# Altium footprint library PCB_Lib_Devzone.PcbLib: 491 footprints (part 27 of 31)
Each footprint in its own frame and in the unit in brackets; x right, y up, seen from the top. Pads: shape width x height; smd on the part's side, far side on the other; paste and mask are expansions set on the pad; w line width, h text height; cw(c..) or ccw(c..) is an arc to the next point about the centre after c.
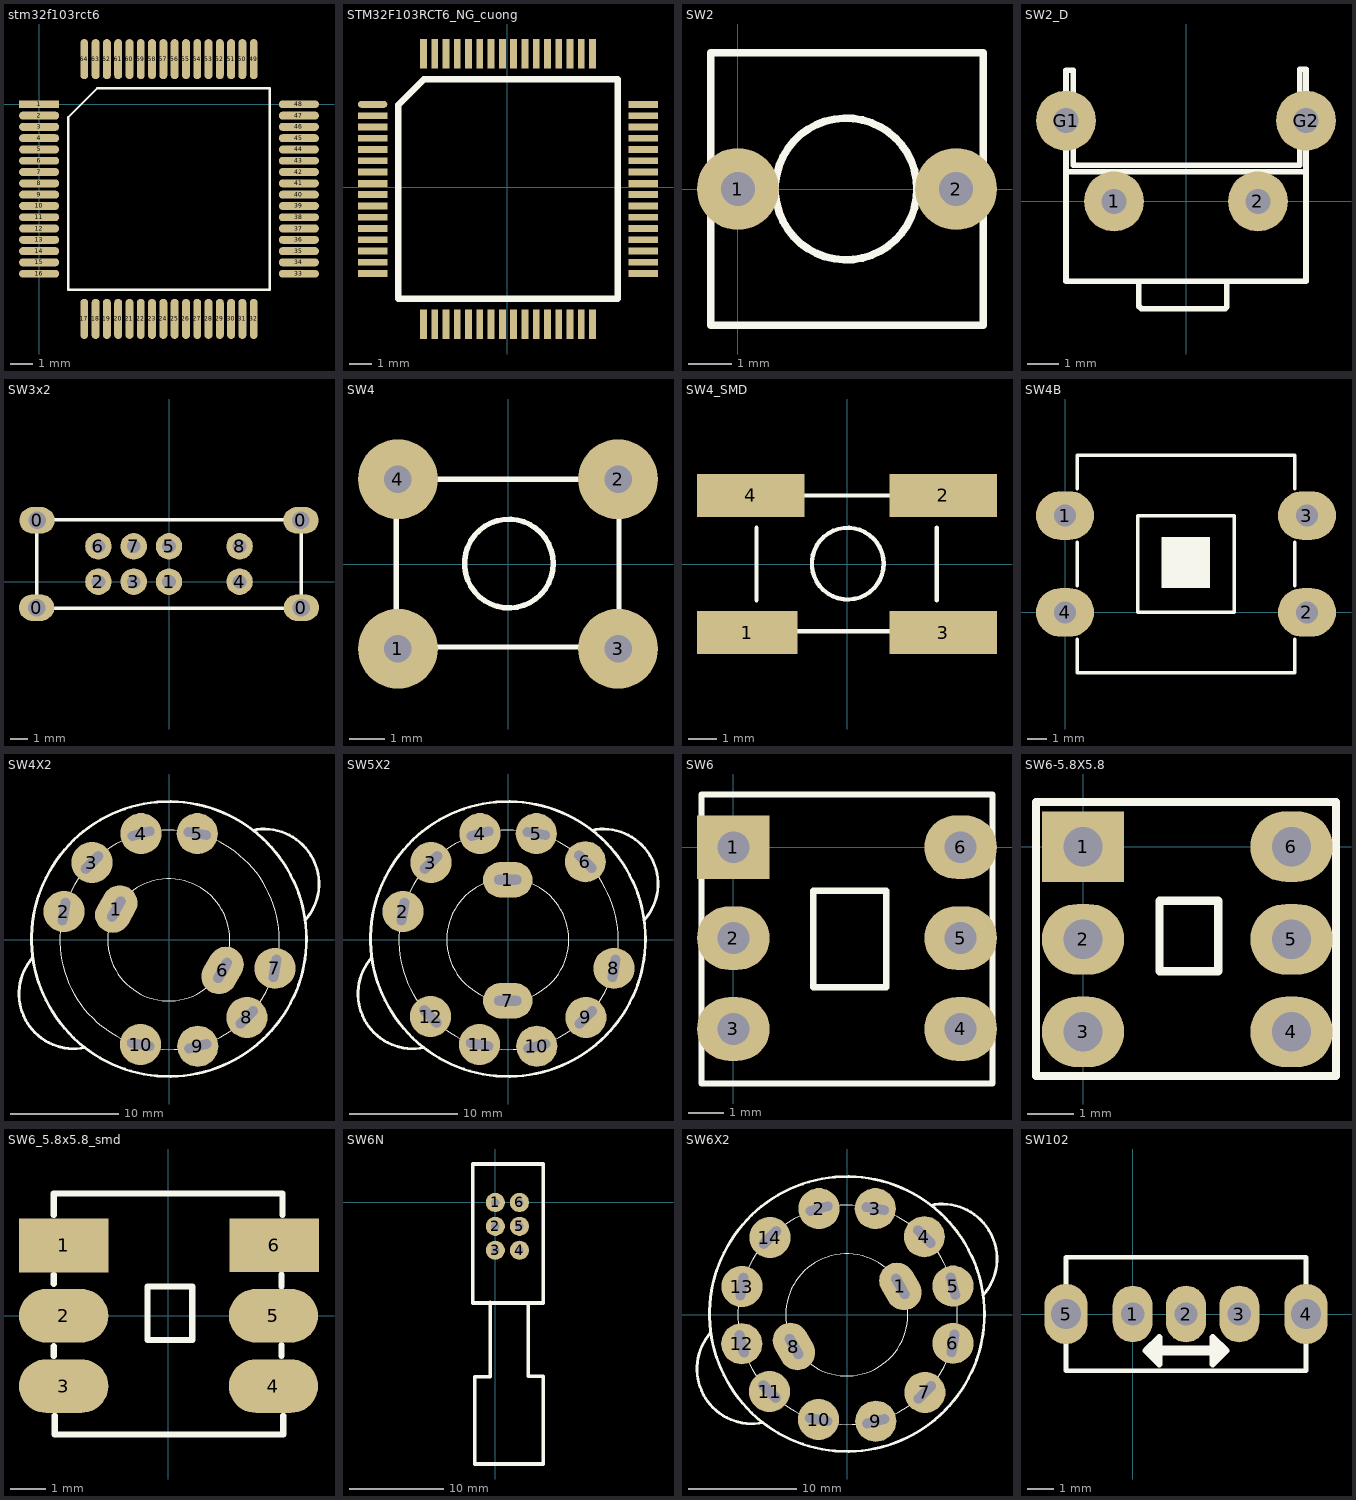
[diagram p26: the footprints below, top view; thin cyan lines are the x and y axes]

## stm32f103rct6 [mm]
pads (64):
  rect 1.781x0.35 smd: 1(0,0)
  oval 1.781x0.35 smd: 2(0,-0.5) 3(0,-1) 4(0,-1.5) 5(0,-2) 6(0,-2.5) 7(0,-3) 8(0,-3.5) 9(0,-4) 10(0,-4.5) 11(0,-5) 12(0,-5.5) 13(0,-6) 14(0,-6.5) 15(0,-7) 16(0,-7.5) 33(11.5,-7.5) 34(11.5,-7) 35(11.5,-6.5) 36(11.5,-6) 37(11.5,-5.5) 38(11.5,-5) 39(11.5,-4.5) 40(11.5,-4) 41(11.5,-3.5) 42(11.5,-3) 43(11.5,-2.5) 44(11.5,-2) 45(11.5,-1.5) 46(11.5,-1) 47(11.5,-0.5) 48(11.5,0)
  oval 0.35x1.781 smd: 17(2,-9.5) 18(2.5,-9.5) 19(3,-9.5) 20(3.5,-9.5) 21(4,-9.5) 22(4.5,-9.5) 23(5,-9.5) 24(5.5,-9.5) 25(6,-9.5) 26(6.5,-9.5) 27(7,-9.5) 28(7.5,-9.5) 29(8,-9.5) 30(8.5,-9.5) 31(9,-9.5) 32(9.5,-9.5) 49(9.5,2) 50(9,2) 51(8.5,2) 52(8,2) 53(7.5,2) 54(7,2) 55(6.5,2) 56(6,2) 57(5.5,2) 58(5,2) 59(4.5,2) 60(4,2) 61(3.5,2) 62(3,2) 63(2.5,2) 64(2,2)
Top Overlay:
  lines w0.1: 1.285,-8.215 10.215,-8.215 10.215,0.715 2.57,0.715 1.285,-0.57 1.285,-8.215
3D body "User Library-LQFP64-0_5.STEP": height 1.56, standoff -0.01, extent -0.12,-9.645 11.652,2.127

## STM32F103RCT6_NG_cuong [mil]
pads (64):
  oval 51.18x12 smd: 1(-235,145)
  rect 51.18x12 smd: 2(-235,125.31) 3(-235,105.63) 4(-235,85.94) 5(-235,66.26) 6(-235,46.58) 7(-235,26.89) 8(-235,7.21) 9(-235,-12.48) 10(-235,-32.16) 11(-235,-51.85) 12(-235,-71.53) 13(-235,-91.22) 14(-235,-110.91) 15(-235,-130.59) 16(-235,-150.28) 33(237.44,-150.28) 34(237.44,-130.59) 35(237.44,-110.91) 36(237.44,-91.22) 37(237.44,-71.53) 38(237.44,-51.85) 39(237.44,-32.16) 40(237.44,-12.48) 41(237.44,7.21) 42(237.44,26.89) 43(237.44,46.58) 44(237.44,66.26) 45(237.44,85.94) 46(237.44,105.63) 47(237.44,125.31) 48(237.44,145)
  rect 12x51.18 smd: 17(-146.42,-238.86) 18(-126.73,-238.86) 19(-107.05,-238.86) 20(-87.36,-238.86) 21(-67.68,-238.86) 22(-47.99,-238.86) 23(-28.31,-238.86) 24(-8.62,-238.86) 25(11.06,-238.86) 26(30.75,-238.86) 27(50.43,-238.86) 28(70.12,-238.86) 29(89.8,-238.86) 30(109.49,-238.86) 31(129.17,-238.86) 32(148.86,-238.86) 49(148.86,233.58) 50(129.17,233.58) 51(109.49,233.58) 52(89.8,233.58) 53(70.12,233.58) 54(50.43,233.58) 55(30.75,233.58) 56(11.06,233.58) 57(-8.62,233.58) 58(-28.31,233.58) 59(-47.99,233.58) 60(-67.68,233.58) 61(-87.36,233.58) 62(-107.05,233.58) 63(-126.73,233.58) 64(-146.42,233.58)
Top Overlay:
  lines w11.81: -190.31,-194.17 192.76,-194.17 192.76,188.9 -145.63,188.9 -190.31,144.21 -190.31,-194.17
3D body "User Library-LQFP64-0_5.STEP": height 61.5, standoff -0.39, extent -230.73,-235.73 232.74,227.74

## SW2 [mil] "SW button 2pin, 250x 250 mil"
height 100
pads (2):
  round 75 hole 31: 1(0,0) 2(200,0)
Top Overlay:
  circle w7: c99.17,0 r65
  lines w7: -25,-125 -25,125 225,125 225,-125 -25,-125
3D body "User Library-EVQQJ.STEP": height 157.48, standoff -669.29, extent -56.47,-161.38 258.49,159.49

## SW2_D [mil] "SW button 2pin, 300x 300 x 250 mil"
height 100
pads (4):
  round 75 hole 31: 1(-90,0) 2(90,0) G1(-150,101) G2(150,101)
Top Overlay:
  lines w7: -150,37 150,37 ; -59,-100 -59,-131 -56,-134 49,-134 51,-132 51,-100 ; -150,-100 150,-100 150,165 142,165 142,45 -141,45 -141,164 -150,164 -150,-100

## SW3x2 [mil] "Switch 3x2 - pin to pin 80"
height 500
pads (12):
  oval 80x60 hole 40: 0(-300,-59) 0(-299,139) 0(299,139) 0(300,-59)
  round 60 hole 31: 1(0,0) 2(-160,0) 3(-80,0) 4(160,0) 5(0,80) 6(-160,80) 7(-80,80) 8(160,80)
Top Overlay:
  lines w8: -300,-60 -300,140 300,140 300,-60 -300,-60

## SW4 [mil] "SW button 4pin, 250 x250 mil"
height 100
pads (4):
  round 90 hole 31: 1(-124,-95) 2(124,96) 3(124,-95) 4(-124,96)
Top Overlay:
  circle w6: c1,1 r50
  lines w6: -126,-50 -126,51 ; -79,-93 79,-93 ; -79,96 79,96 ; 125,-50 125,51
  lines w7: 115,-119 116,-118
3D body "SW3dPS-.STEP": height 275.59, standoff -137.8, extent -159.51,-124 151.51,120.09

## SW4_SMD [mil]
pads (4):
  rect 140x60 smd: 1(-139,-95)
  rect 150x60 smd: 2(134,96) 3(134,-95) 4(-134,96)
Top Overlay:
  circle w6: c1,1 r50
  lines w6: -126,-50 -126,51 ; -79,-93 79,-93 ; -79,96 79,96 ; 125,-50 125,51
  lines w7: 115,-119 116,-118
3D body "SW3dPS-.STEP": height 275.59, standoff -137.8, extent -159.51,-124 151.51,120.09

## SW4B [mil] "SW button 4pin, 450 x 450 mil"
height 100
pads (4):
  oval 120x100 hole 45: 1(0,200) 2(500,0) 3(500,200) 4(0,0)
Top Overlay:
  rectangle: 199,50 300,156
  lines w7: 25,-55 25,-125 475,-125 475,-55 ; 25,55 25,145 ; 25,255 25,325 475,325 475,255 ; 475,55 475,145 ; 150,0 350,0 350,200 150,200 150,0
3D body "SW3dPS-omron b3w-4000 switch.STEP": height 169.29, standoff -57.09, extent -3.21,-129.22 469.23,343.23

## SW4X2 [mil] "Switch 4x2"
height 500
pads (10):
  oval 180x130 hole 35 slot 100 at 60 deg rot 60: 1(-193.57,112.51) 6(193.7,-111.07)
  round 150 hole 35 slot 100 at 80 deg: 2(-384.48,103.48) 7(384.48,-103.48)
  round 150 hole 35 slot 100 at 45 deg: 3(-282.26,282.26) 8(282.26,-282.26)
  round 150 hole 35 slot 100 at 15 deg: 4(-103.48,387.48) 9(103.48,-387.48)
  round 150 hole 35 slot 100 at 170 deg: 5(101.54,387.46) 10(-105.2,-381.27)
Top Overlay:
  circle w10: c-1.46,3.46 r501
  circle w1: c0.54,0.46 r400
  circle w1: c-2.46,0.46 r222.5
  lines w10: -498,-63.94 ccw(c-348.29,-196.56) -307.65,-392.38 ; 303.52,399.93 cw(c345.18,204.32) 495.11,71.95

## SW5X2 [mil] "Switch 5x2"
height 500
pads (12):
  oval 180x130 hole 35 slot 100 at 0 deg: 1(-2.46,219.46) 7(-2.46,-221.54)
  round 150 hole 35 slot 100 at 80 deg: 2(-384.48,103.48) 8(384.48,-103.48)
  round 150 hole 35 slot 100 at 45 deg: 3(-282.26,282.26) 9(282.26,-282.26)
  round 150 hole 35 slot 100 at 15 deg: 4(-103.48,387.48) 10(103.48,-387.48)
  round 150 hole 35 slot 100 at 170 deg: 5(101.54,387.46) 11(-105.2,-381.27)
  round 150 hole 35 slot 100 at 135 deg: 6(280.32,285.24) 12(-283.98,-279.05)
Top Overlay:
  circle w10: c-1.46,3.46 r501
  circle w1: c0.54,0.46 r400
  circle w1: c-2.46,0.46 r222.5
  lines w10: -498,-63.94 ccw(c-348.29,-196.56) -307.65,-392.38 ; 303.52,399.93 cw(c345.18,204.32) 495.11,71.95

## SW6 [mil] "SW DTDP - 6Pin 260x300x300 mil"
pads (6):
  rect 80x70 hole 35: 1(0,0)
  oval 80x70 hole 35: 2(0,-100) 3(0,-200) 4(250,-200) 5(250,-100) 6(250,0)
Top Overlay:
  lines w7: -35,-260 -35,58 285,58 285,-260 -35,-260 ; 88,-154 88,-48 168,-48 168,-154 88,-154
3D body "User Library-PSM1-0-0.STEP": height 532.1, standoff -137.19, extent -33.48,-259.48 281.48,55.49

## SW6-5.8X5.8 [mm]
pads (6):
  rect 1.778x1.524 hole 0.85: 1(0,0)
  oval 1.778x1.524 hole 0.85: 2(0,-2) 3(0,-4) 4(4.5,-4) 5(4.5,-2) 6(4.5,0)
Top Overlay:
  lines w0.178: -1.016,-4.953 5.461,-4.953 5.461,0.965 -1.016,0.965 -1.016,-4.953 ; 1.651,-2.692 2.921,-2.692 2.921,-1.168 1.651,-1.168 1.651,-2.692
3D body: height 5.5, standoff 0.5, extent -0.889,-4.826 5.334,0.889
3D body: height 3.5, standoff 0.5, extent 3.81,-4.851 5.359,0.914
3D body: height 3.5, standoff 0.5, extent -0.914,-4.851 0.69,0.914
3D body: height 3.5, standoff 2.5, extent 2.921,-4.851 3.81,0.914
3D body: height 3.5, standoff 2.5, extent 0.69,-4.851 1.579,0.914
3D body: height 9.5, standoff 5.5, extent 1.575,-2.87 3.023,-1.143
3D body: height 7.5, standoff 5.5, extent 1.295,-3.2 3.353,-0.813
3D body: height 10, standoff 9, extent 1.295,-3.2 3.353,-0.813
3D body: height 4, standoff -3, extent 4.203,-4.299 4.8,-3.7
3D body: height 4, standoff -3, extent 4.203,-2.299 4.8,-1.7
3D body: height 4, standoff -3, extent 4.203,-0.299 4.8,0.3
3D body: height 4, standoff -3, extent -0.297,-0.299 0.3,0.3
3D body: height 4, standoff -3, extent -0.297,-2.299 0.3,-1.7
3D body: height 4, standoff -3, extent -0.297,-4.299 0.3,-3.7

## SW6_5.8x5.8_smd [mil]
pads (6):
  rect 100x60 smd: 1(-117,78.74) 6(119,79)
  oval 100x60 smd: 2(-117,0) 3(-117,-78.74) 4(118,-78.74) 5(118,0)
Top Overlay:
  lines w7: -128,-45 -128,-34 ; -128,36 -128,46 ; -128,113 -128,137 128,137 128,113 ; -127,-112 -127,-133 128,-133 ; 127,-45 127,-33 ; 127,33 127,46 ; 129,-112 129,-133 127,-133 ; 127,-133 128,-133 ; 127,-133 128,-133 ; -23,-27.26 -23,32.74 27,32.74 27,-27.26 -23,-27.26
3D body: height 157.48, standoff -118.11, extent -99.71,-90.52 -76.18,-66.94
3D body: height 157.48, standoff -118.11, extent -99.71,-11.78 -76.18,11.8
3D body: height 157.48, standoff -118.11, extent -99.71,66.96 -76.18,90.54
3D body: height 157.48, standoff -118.11, extent 77.45,66.96 100.98,90.54
3D body: height 157.48, standoff -118.11, extent 77.45,-11.78 100.98,11.8
3D body: height 157.48, standoff -118.11, extent 77.45,-90.52 100.98,-66.94
3D body: height 393.7, standoff 354.33, extent -37,-47.26 44,46.74
3D body: height 295.28, standoff 216.54, extent -37,-47.26 44,46.74
3D body: height 374.02, standoff 216.54, extent -26,-34.26 31,33.74
3D body: height 137.8, standoff 98.43, extent -60.83,-112.26 -25.83,114.74
3D body: height 137.8, standoff 98.43, extent 27,-112.26 62,114.74
3D body: height 137.8, standoff 19.68, extent -124,-112.26 -60.83,114.74
3D body: height 137.8, standoff 19.68, extent 62,-112.26 123,114.74
3D body: height 216.54, standoff 19.68, extent -123,-111.26 122,113.74

## SW6N [mil]
pads (6):
  round 80 hole 35: 1(0,0) 2(0,-100) 3(0,-200) 4(101,-200) 5(101,-100) 6(101,0)
Top Overlay:
  lines w15: -21,-419 -21,-730 -87,-730 -87,-1095 201,-1095 201,-728 137,-728 137,-421 142,-421 ; -95,-421 200,-421 200,161 -95,161 -95,-421
3D body "User Library-DPDT Push Switch-1.STEP": height 394.31, standoff -156.88, extent -95,-1096.66 200.28,161.56

## SW6X2 [mil] "Switch 6x2"
height 500
pads (14):
  oval 180x130 hole 35 slot 100 at 120 deg rot 120: 1(193,104) 8(-195,-115)
  round 150 hole 35 slot 100 at 15 deg: 2(-103.48,387.48) 9(103.48,-387.48)
  round 150 hole 35 slot 100 at 170 deg: 3(101.54,387.46) 10(-105.2,-381.27)
  round 150 hole 35 slot 100 at 135 deg: 4(280.32,285.24) 11(-283.98,-279.05)
  round 150 hole 35 slot 100 at 105 deg: 5(385,105) 12(-385,-105)
  round 150 hole 35 slot 100 at 80 deg: 6(384.48,-103.48) 13(-384.48,103.48)
  round 150 hole 35 slot 100 at 45 deg: 7(282.26,-282.26) 14(-282.26,282.26)
Top Overlay:
  circle w10: c-1.46,3.46 r501
  circle w1: c0.54,0.46 r400
  circle w1: c-2.46,0.46 r222.5
  lines w10: -498,-63.94 ccw(c-348.29,-196.56) -307.65,-392.38 ; 303.52,399.93 cw(c345.18,204.32) 495.11,71.95

## SW102 [mil] "Switch 102 On Board nho"
height 2
pads (5):
  oval 60x85 hole 35: 1(0,0) 2(80,0) 3(160,0)
  oval 65x90 hole 45: 4(260,0) 5(-100,0)
Top Overlay:
  lines w7: -100,-45 -100,-85 260,-85 260,-45 ; -100,45 -100,85 260,85 260,45
  lines w10: 20,-55 40,-75 40,-35 20,-55 ; 120,-75 140,-55 120,-35 120,-75
  lines w15: 30,-55 130,-55